# Altium footprint library Keyboard_parts.PcbLib: 52 footprints (part 4 of 4)
Each footprint in its own frame and in the unit in brackets; x right, y up, seen from the top. Pads: shape width x height; smd on the part's side, far side on the other; paste and mask are expansions set on the pad; w line width, h text height; cw(c..) or ccw(c..) is an arc to the next point about the centre after c.
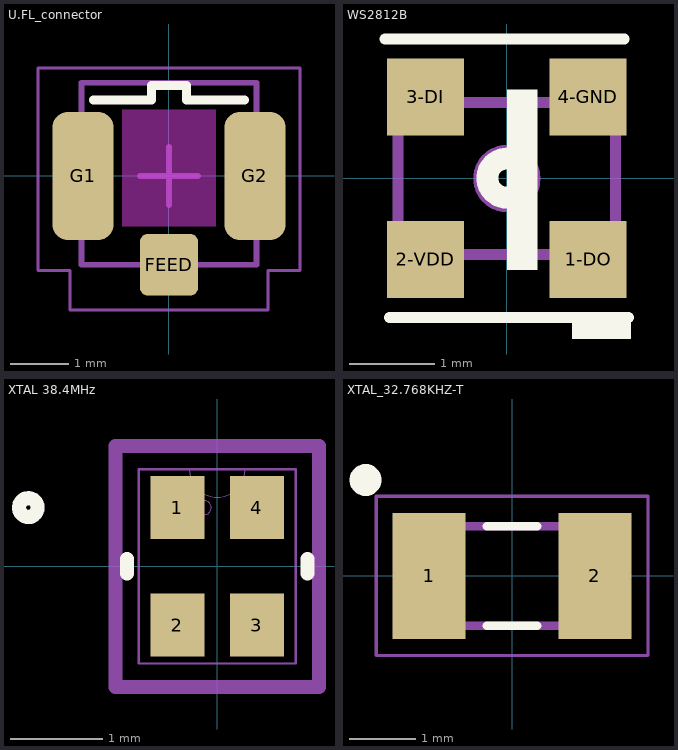
[diagram p3: the footprints below, top view; thin cyan lines are the x and y axes]

## U.FL_connector [mm]
pads (3):
  rrect25% 1x1.05 smd mask+0.051: FEED(0,-1.525)
  rrect50% 1.05x2.2 smd mask+0.051: G1(-1.475,0) G2(1.475,0)
Top Layer keep-out:
  region: -0.8,-0.863 0.8,-0.863 0.8,1.137 -0.8,1.137
Top Overlay:
  lines w0.152: -1.3,1.303 -0.3,1.303 -0.3,1.553 0.3,1.553 0.3,1.303 1.3,1.303
Mechanical 13:
  lines w0.1: -1.5,-1.525 1.5,-1.525 1.5,1.6 -1.5,1.6 -1.5,-1.525
Mechanical 15:
  lines w0.05: -2.25,-1.625 -1.7,-1.625 -1.7,-2.3 1.7,-2.3 1.7,-1.625 2.25,-1.625 2.25,1.85 -2.25,1.85 -2.25,-1.625
  lines w0.1: -0.5,0 0.5,0 ; 0,-0.5 0,0.5
Mechanical 29:
  lines w0.1: -1.5,-1.525 -1.5,1.6 1.5,1.6 1.5,-1.525 -1.5,-1.525
  text ".Designator" at -0.85,-0.2 h0.5
3D body "User Library-U_FL-R-SMT-1.step": height 1.25, standoff -0.01, extent -1.5,-1.513 1.5,1.587

## WS2812B [mm]
pads (4):
  rect 0.9x0.9 smd: 1-DO(0.95,-0.95) 2-VDD(-0.95,-0.95) 3-DI(-0.95,0.95) 4-GND(0.95,0.95)
Top Overlay:
  circle w0.254: c0,0 r0.229
  rectangle: 0.762,-1.88 1.448,-1.626
  rectangle: -0.001,-1.072 0.356,1.037
  lines w0.127: -1.422,1.626 1.372,1.626 ; -1.372,-1.63 1.422,-1.63
Mechanical 13:
  circle w0.127: c-0.001,-0.005 r0.33
  lines w0.127: -1.271,-0.894 -1.271,0.884 1.269,0.884 1.269,-0.894 -1.271,-0.894

## XTAL 38.4MHz [mil]
pads (4):
  rect 23x27 smd paste+0 mask+0: 1(-17,25.1) 2(-17,-25.1) 3(17,-25.1) 4(17,25.1)
Top Overlay:
  circle w6: c-80.7,25.1 r4
  lines w6: -38.5,-3.14 -38.5,3.14 ; 38.5,-3.14 38.5,3.14
Mechanical 13:
  circle w0: c-5.5,25.1 r3
  lines w0: -12,41.5 ccw(c0,41.5) 12,41.5
  lines w1: -33.5,-41.5 33.5,-41.5 33.5,41.5 -33.5,41.5 -33.5,-41.5
Mechanical 15:
  lines w6: -43.5,-51.5 -43.5,-48.6 -43.5,48.6 -43.5,51.5 43.5,51.5 43.5,48.6 43.5,-48.6 43.5,-51.5 -43.5,-51.5
3D body "8Y384_TXC.step": height 20.12, standoff 0, extent -33.5,-41.5 33.5,41.5

## XTAL_32.768KHZ-T [mm]
height 0.9
pads (2):
  rect 1.1x1.9 smd: 1(-1.25,0) 2(1.25,0)
Top Overlay:
  circle w0.254: c-2.21,1.448 r0.114
  lines w0.127: -0.38,-0.75 0.38,-0.75 ; -0.38,0.75 0.38,0.75
Mechanical 13:
  lines w0.127: -1.6,-0.75 1.6,-0.75 1.6,0.75 -1.6,0.75 -1.6,-0.75
Mechanical 15:
  lines w0.05: -2.05,-1.2 2.05,-1.2 2.05,1.2 -2.05,1.2 -2.05,-1.2
3D body "step_temp.STEP": height 0.89, standoff 0, extent -1.6,-0.749 1.6,0.749